# Altium footprint library SAWACO.PcbLib: 45 footprints (part 1 of 3)
Each footprint in its own frame and in the unit in brackets; x right, y up, seen from the top. Pads: shape width x height; smd on the part's side, far side on the other; paste and mask are expansions set on the pad; w line width, h text height; cw(c..) or ccw(c..) is an arc to the next point about the centre after c.
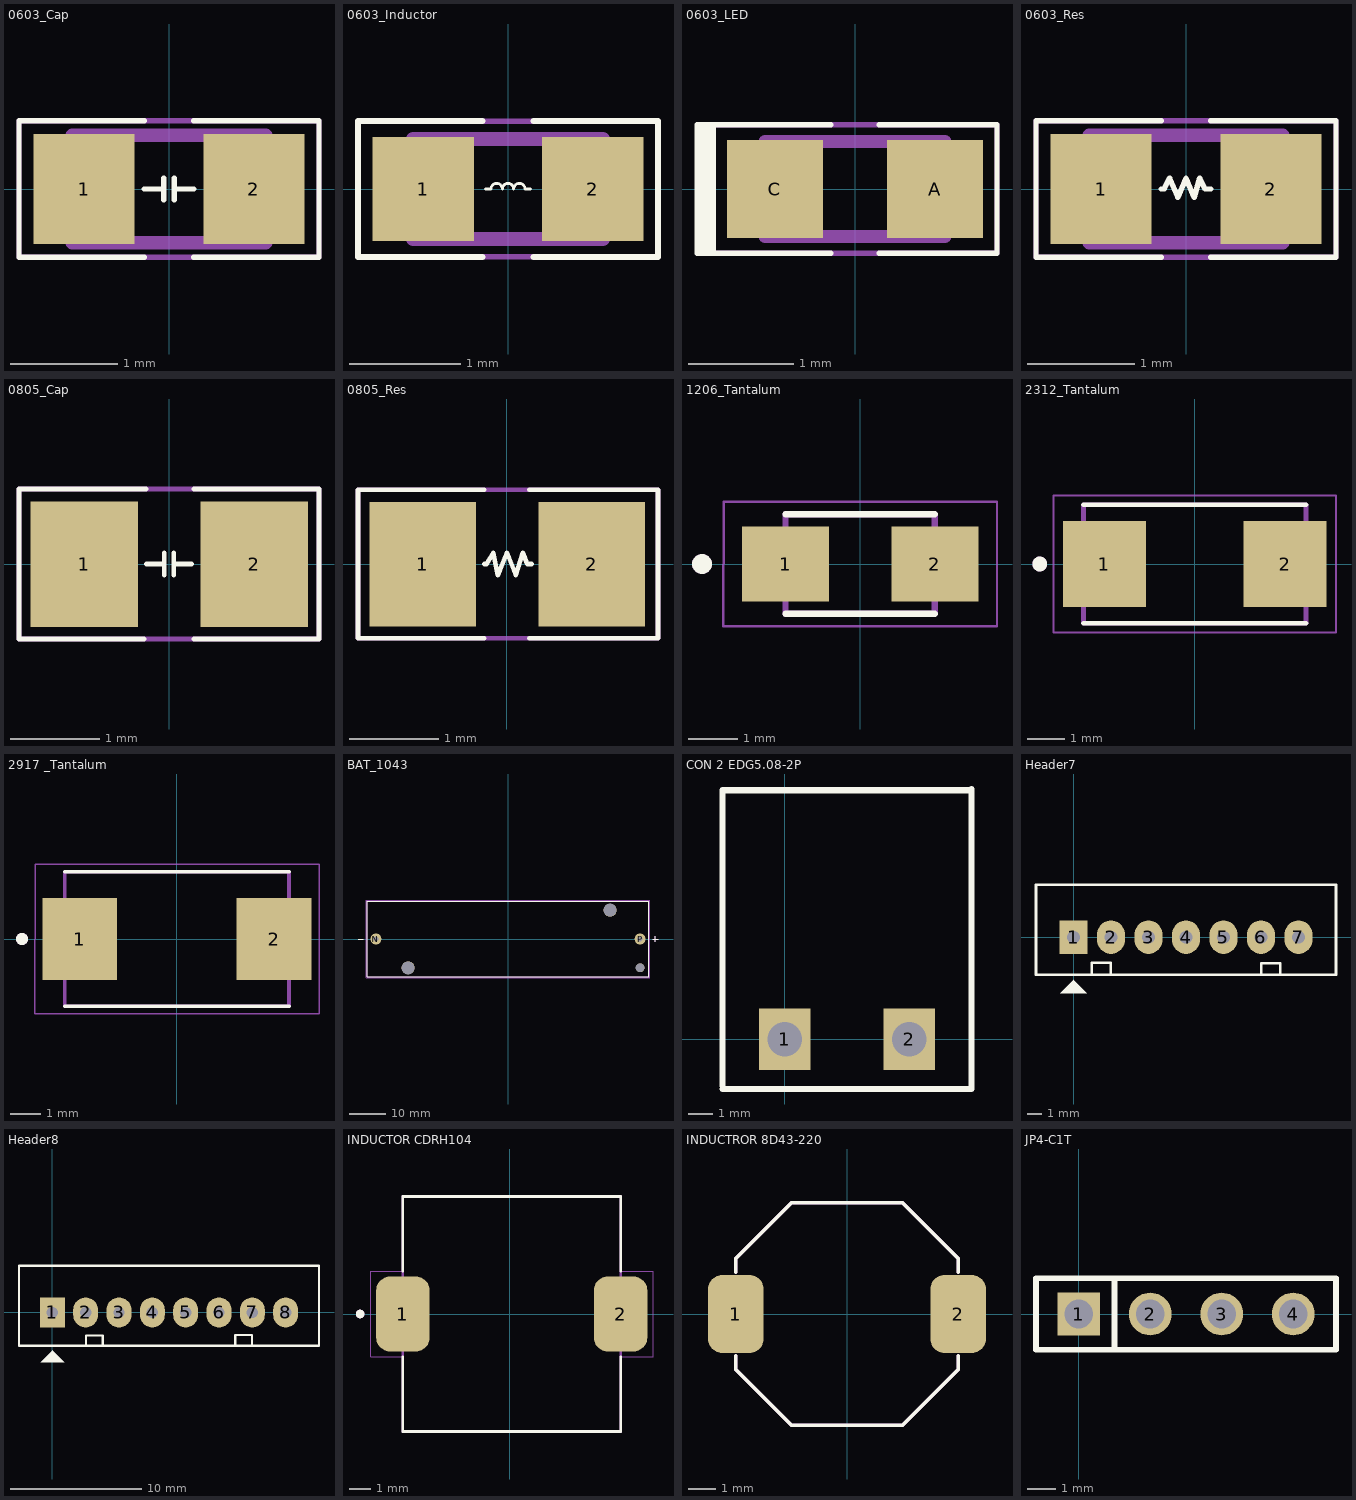
[diagram p0: the footprints below, top view; thin cyan lines are the x and y axes]

## 0603_Cap [mm]
pads (2):
  rect 0.94x1.02 smd: 1(-0.79,0) 2(0.79,0)
Top Overlay:
  lines w0.051: -0.229,-0.635 -1.397,-0.635 -1.397,0.635 -0.229,0.635 ; -0.229,0 -0.076,0 ; -0.051,-0.102 -0.051,0.102 ; 0.051,-0.102 0.051,0.102 ; 0.076,0 0.229,0 ; 0.229,-0.635 1.397,-0.635 1.397,0.635 0.229,0.635
Mechanical 13:
  lines w0.127: -0.9,-0.5 0.9,-0.5 0.9,0.5 -0.9,0.5 -0.9,-0.5
Mechanical 15:
  lines w0.05: -1.397,-0.635 1.397,-0.635 1.397,0.635 -1.397,0.635 -1.397,-0.635
3D body "step_temp.STEP": height 0.23, standoff -0.23, extent -0.8,-0.4 0.8,0.4

## 0603_Inductor [mm]
pads (2):
  rect 0.91x0.93 smd: 1(-0.76,0)
  rect 0.91x0.93 smd mask+0.102: 2(0.76,0)
Top Overlay:
  lines w0.025: -0.203,0 -0.152,0 cw(c-0.102,0) -0.051,0 cw(c0,0) 0.051,0 cw(c0.102,0) 0.152,0 0.203,0
  lines w0.051: -0.229,-0.61 -1.346,-0.61 -1.346,0.61 -0.229,0.61 ; 0.229,-0.61 1.346,-0.61 1.346,0.61 0.229,0.61
Mechanical 13:
  lines w0.127: -0.85,-0.45 -0.85,0.45 0.85,0.45 0.85,-0.45 -0.85,-0.45
Mechanical 15:
  lines w0.05: -1.346,-0.61 1.346,-0.61 1.346,0.61 -1.346,0.61

## 0603_LED [mm]
pads (2):
  rect 0.91x0.93 smd mask+0.102: A(0.76,0)
  rect 0.91x0.93 smd: C(-0.76,0)
Top Overlay:
  lines w0.051: -1.372,0.61 -1.372,-0.61 -1.499,-0.61 ; -1.295,0.61 -1.448,0.61 -1.448,-0.61 -1.346,-0.61 ; -1.27,0.61 -1.473,0.61 -1.473,-0.61 -1.499,-0.61 ; -0.229,-0.61 -1.346,-0.61 ; -0.229,0.61 -1.346,0.61 -1.346,-0.61 ; 0.229,-0.61 1.346,-0.61 1.346,0.61 0.229,0.61 ; -1.499,-0.61 -1.499,0.61 -1.397,0.61 ; -1.397,0.61 -1.321,0.61 -1.422,0.61 -1.422,-0.61 -1.346,-0.61 ; -1.397,0.61 -1.397,-0.61 -1.346,-0.61
Mechanical 13:
  lines w0.127: -0.85,-0.45 -0.85,0.45 0.85,0.45 0.85,-0.45 -0.85,-0.45
Mechanical 15:
  lines w0.05: -1.346,-0.61 -1.346,0.61 1.346,0.61 1.346,-0.61 -1.346,-0.61

## 0603_Res [mm]
pads (2):
  rect 0.94x1.02 smd: 1(-0.79,0) 2(0.79,0)
Top Overlay:
  lines w0.051: -0.229,-0.635 -1.397,-0.635 -1.397,0.635 -0.229,0.635 ; -0.229,0 -0.203,0 -0.152,0.102 -0.076,-0.076 0,0.102 0.076,-0.076 0.127,0.102 0.178,0 0.229,0 ; 0.229,-0.635 1.397,-0.635 1.397,0.635 0.229,0.635
Mechanical 13:
  lines w0.127: -0.9,-0.5 0.9,-0.5 0.9,0.5 -0.9,0.5 -0.9,-0.5
Mechanical 15:
  lines w0.05: -1.397,-0.635 1.397,-0.635 1.397,0.635 -1.397,0.635 -1.397,-0.635
3D body "step_temp.STEP": height 0.23, standoff -0.23, extent -0.8,-0.4 0.8,0.4

## 0805_Cap [mm]
pads (2):
  rect 1.2x1.4 smd: 1(-0.946,-0.003) 2(0.954,-0.003)
Top Overlay:
  lines w0.051: -0.279,-0.838 -1.676,-0.838 -1.676,0.838 -0.254,0.838 ; -0.254,0 -0.051,0 ; -0.051,-0.127 -0.051,0.127 ; 0.051,-0.127 0.051,0.127 ; 0.051,0 0.254,0 ; 0.279,-0.838 1.676,-0.838 1.676,0.838 0.279,0.838
Mechanical 15:
  lines w0.051: -1.676,-0.838 1.676,-0.838 1.676,0.838 -1.676,0.838 -1.676,-0.838
3D body "SW3dPS-smt_resistor_packages.STEP": height 0.61, standoff -0.01, extent -1.006,-0.638 1.014,0.632

## 0805_Res [mm]
pads (2):
  rect 1.2x1.4 smd: 1(-0.946,-0.003) 2(0.954,-0.003)
Top Overlay:
  lines w0.051: -0.254,-0.838 -1.676,-0.838 -1.676,0.838 -0.254,0.838 ; -0.254,0 -0.229,0 -0.152,0.127 -0.102,-0.127 0,0.127 0.102,-0.127 0.178,0.127 0.229,0 0.279,0 ; 0.254,-0.838 1.702,-0.838 1.702,0.838 0.254,0.838
Mechanical 15:
  lines w0.051: -0.305,-0.838 0.305,-0.838 ; -0.279,0.838 0.254,0.838 1.702,0.838 1.702,-0.838 0.254,-0.838 ; -0.254,-0.838 -1.676,-0.838 -1.676,0.838 -0.254,0.838
3D body "SW3dPS-smt_resistor_packages.STEP": height 0.61, standoff -0.01, extent -1.006,-0.638 1.014,0.632

## 1206_Tantalum [mm]
pads (2):
  rect 1.75x1.5 smd: 1(-1.5,0) 2(1.5,0)
Top Overlay:
  circle w0.2: c-3.18,0 r0.1
  lines w0.127: -1.5,-1 1.5,-1 ; -1.5,1 1.5,1
Mechanical 13:
  circle w0.2: c-3.18,0 r0.1
  lines w0.127: -1.5,-1 1.5,-1 1.5,1 -1.5,1 -1.5,-1
Mechanical 15:
  lines w0.05: -2.75,-1.25 2.75,-1.25 2.75,1.25 -2.747,1.25 -2.75,-1.25
3D body "TBJA475K020RBLC0024.STEP": height 1.8, standoff 0, extent -1.6,-0.8 1.6,0.8

## 2312_Tantalum [mm]
pads (2):
  rect 2.24x2.32 smd: 1(-2.435,0) 2(2.435,0)
Top Overlay:
  circle w0.2: c-4.18,0 r0.1
  lines w0.127: -3,-1.6 3,-1.6 ; -3,1.6 3,1.6
Mechanical 13:
  circle w0.2: c-4.18,0 r0.1
  lines w0.127: -3,-1.6 3,-1.6 3,1.6 -3,1.6 -3,-1.6
Mechanical 15:
  lines w0.05: -3.81,-1.85 3.81,-1.85 3.81,1.85 -3.805,1.85 -3.81,-1.85
3D body "TAJC157K010RNJ--3DModel-STEP-269445.STEP": height 2.8, standoff 0, extent -3,-1.6 3,1.6

## 2917 _Tantalum [mm]
pads (2):
  rect 2.5x2.75 smd: 1(-3.25,0) 2(3.25,0)
Top Overlay:
  circle w0.2: c-5.18,0 r0.1
  lines w0.127: -3.75,-2.25 3.75,-2.25 ; -3.75,2.25 3.75,2.25
Mechanical 13:
  circle w0.2: c-5.18,0 r0.1
  lines w0.127: -3.75,-2.25 -3.75,2.25 3.75,2.25 3.75,-2.25 -3.75,-2.25
Mechanical 15:
  lines w0.05: -4.752,-2.5 4.75,-2.5 4.75,2.5 -4.745,2.5 -4.752,-2.5
3D body "TPSD476K025R0125.STEP": height 3.1, standoff 0, extent -3.65,-2.15 3.65,2.15

## BAT_1043 [mm]
height 14.86
pads (5):
  round 3 hole 1.32: N(-36.11,0) P(36.11,0)
  round 3.55 hole 3.55 unplated: ""(-27.29,-7.87) ""(27.91,7.87)
  round 2.39 hole 2.39 unplated: ""(36.11,-7.87)
Top Overlay:
  lines w0.127: -41,0 -39.5,0 ; 39.5,0 41,0 ; 40.25,-0.75 40.25,0.75 ; -38.525,-10.325 38.525,-10.325 38.525,10.325 -38.525,10.325 -38.525,-10.325
Mechanical 13:
  lines w0.127: -41,0 -39.5,0 ; 39.5,0 41,0 ; 40.25,-0.75 40.25,0.75 ; -38.525,-10.325 38.525,-10.325 38.525,10.325 -38.525,10.325 -38.525,-10.325
Mechanical 15:
  lines w0.05: -38.775,-10.575 38.775,-10.575 38.775,10.575 -38.775,10.575 -38.775,-10.575
3D body "step_temp.STEP": height 14.86, standoff -3.56, extent -38.532,-10.325 38.532,10.325

## CON 2 EDG5.08-2P [mm]
pads (2):
  rect 2.1x2.5 hole 1.4: 1(0,0) 2(5.08,0)
Top Overlay:
  lines w0.254: -2.54,-2.032 7.62,-2.032 7.62,10.211 ; -2.54,-1.905 -2.54,10.173 ; -2.54,10.16 7.62,10.16
3D body "User Library-BigHeader 5EHDR_1P.step": height 3.15, standoff -9.32, extent 2.58,-1.75 7.58,10.25
3D body "User Library-BigHeader 5EHDR_1P.step": height 3.15, standoff -9.32, extent -2.5,-1.75 2.5,10.25

## Header7 [mil]
pads (7):
  rect 75x90 hole 34: 1(0,0)
  oval 75x90 hole 34: 2(100,0) 3(200,0) 4(300,0) 5(400,0) 6(500,0) 7(600,0)
Top Overlay:
  region: -35.5,-149.5 35.5,-149.5 0.5,-114.5 0.5,-113.5
  lines w7: 49,-98 49,-68 99,-68 99,-98 ; 501,-99 501,-69 551,-69 551,-99 ; -100,-100 700,-100 700,0 700,140 -100,140 -100,-100

## Header8 [mil]
pads (8):
  rect 75x90 hole 34: 1(0,0)
  oval 75x90 hole 34: 2(100,0) 3(200,0) 4(300,0) 5(400,0) 6(500,0) 7(600,0) 8(700,0)
Top Overlay:
  region: -35.5,-149.5 35.5,-149.5 0.5,-114.5 0.5,-113.5
  lines w7: 101,-99 101,-69 151,-69 151,-99 ; 549,-98 549,-68 599,-68 599,-98 ; -100,-100 -100,140 800,140 800,0 800,-100 -100,-100

## INDUCTOR CDRH104 [mm] "CDRH104 Cu?n C?m Dan SMD 1038-220 22uH 3.6A"
pads (2):
  rrect50% 2.5x3.5 smd: 1(-5,0) 2(5.2,0)
Top Overlay:
  circle w0.2: c-7,0 r0.1
  lines w0.127: -5,-2 -5,-5.5 5.2,-5.5 5.2,-2 ; -5,2 -5,5.5 5.207,5.5 5.207,2
Mechanical 13:
  circle w0.2: c-7,0 r0.1
  lines w0.127: -5,-5.5 -5,5.5 5.2,5.5 5.2,-5.5 -5,-5.5
Mechanical 15:
  lines w0.05: -6.5,-2 -6.5,2 -5,2 -5,5.5 5.2,5.5 5.2,2 6.725,2 6.725,-2 5.2,-2 5.2,-5.5 -5,-5.5 -5,-2 -6.5,-2

## INDUCTROR 8D43-220 [mm] "Inductor SMD 8D43-220 22uH 3.25A"
pads (2):
  rrect50% 2x2.8 smd: 1(-4,0) 2(4,0)
Top Overlay:
  lines w0.127: -4,-1.5 -4,-2 ; -4,1.5 -4,2 ; 4,-1.5 4,-2 2,-4 -2,-4 -4,-2 ; 4,1.5 4,2 2,4 -2,4 -4,2 ; -4,-2 -4,-2 ; -4,2 -4,2
Mechanical 13:
  lines w0.127: -4,1.5 -4,2 -2,4 2,4 4,2 4,1.5 ; 4,-1.5 4,-2 2,-4 -2,-4 -4,-2 ; -4,-2 -4,-1.5 ; -4,-2 -4,-1.5 ; -4,-2 -4,-1.5
3D body "SMD 8D43-220 v1.step": height 4.5, standoff 0, extent -4.329,-4.329 4.33,4.33

## JP4-C1T [mm]
pads (4):
  rect 1.52x1.52 hole 1.02: 1(0,0)
  round 1.52 hole 1.02: 2(2.54,0) 3(5.08,0) 4(7.62,0)
Top Overlay:
  lines w0.2: 1.27,-1.27 1.27,1.27 ; -1.52,-1.27 9.14,-1.27 9.14,1.27 -1.52,1.27 -1.52,-1.27
3D body "61300411821.stp": height 8.51, standoff -3.09, extent -1.52,-1.25 9.14,1.25